# Altium footprint library 未分类器件.PcbLib: 52 footprints (part 1 of 4)
Each footprint in its own frame and in the unit in brackets; x right, y up, seen from the top. Pads: shape width x height; smd on the part's side, far side on the other; paste and mask are expansions set on the pad; w line width, h text height; cw(c..) or ccw(c..) is an arc to the next point about the centre after c.
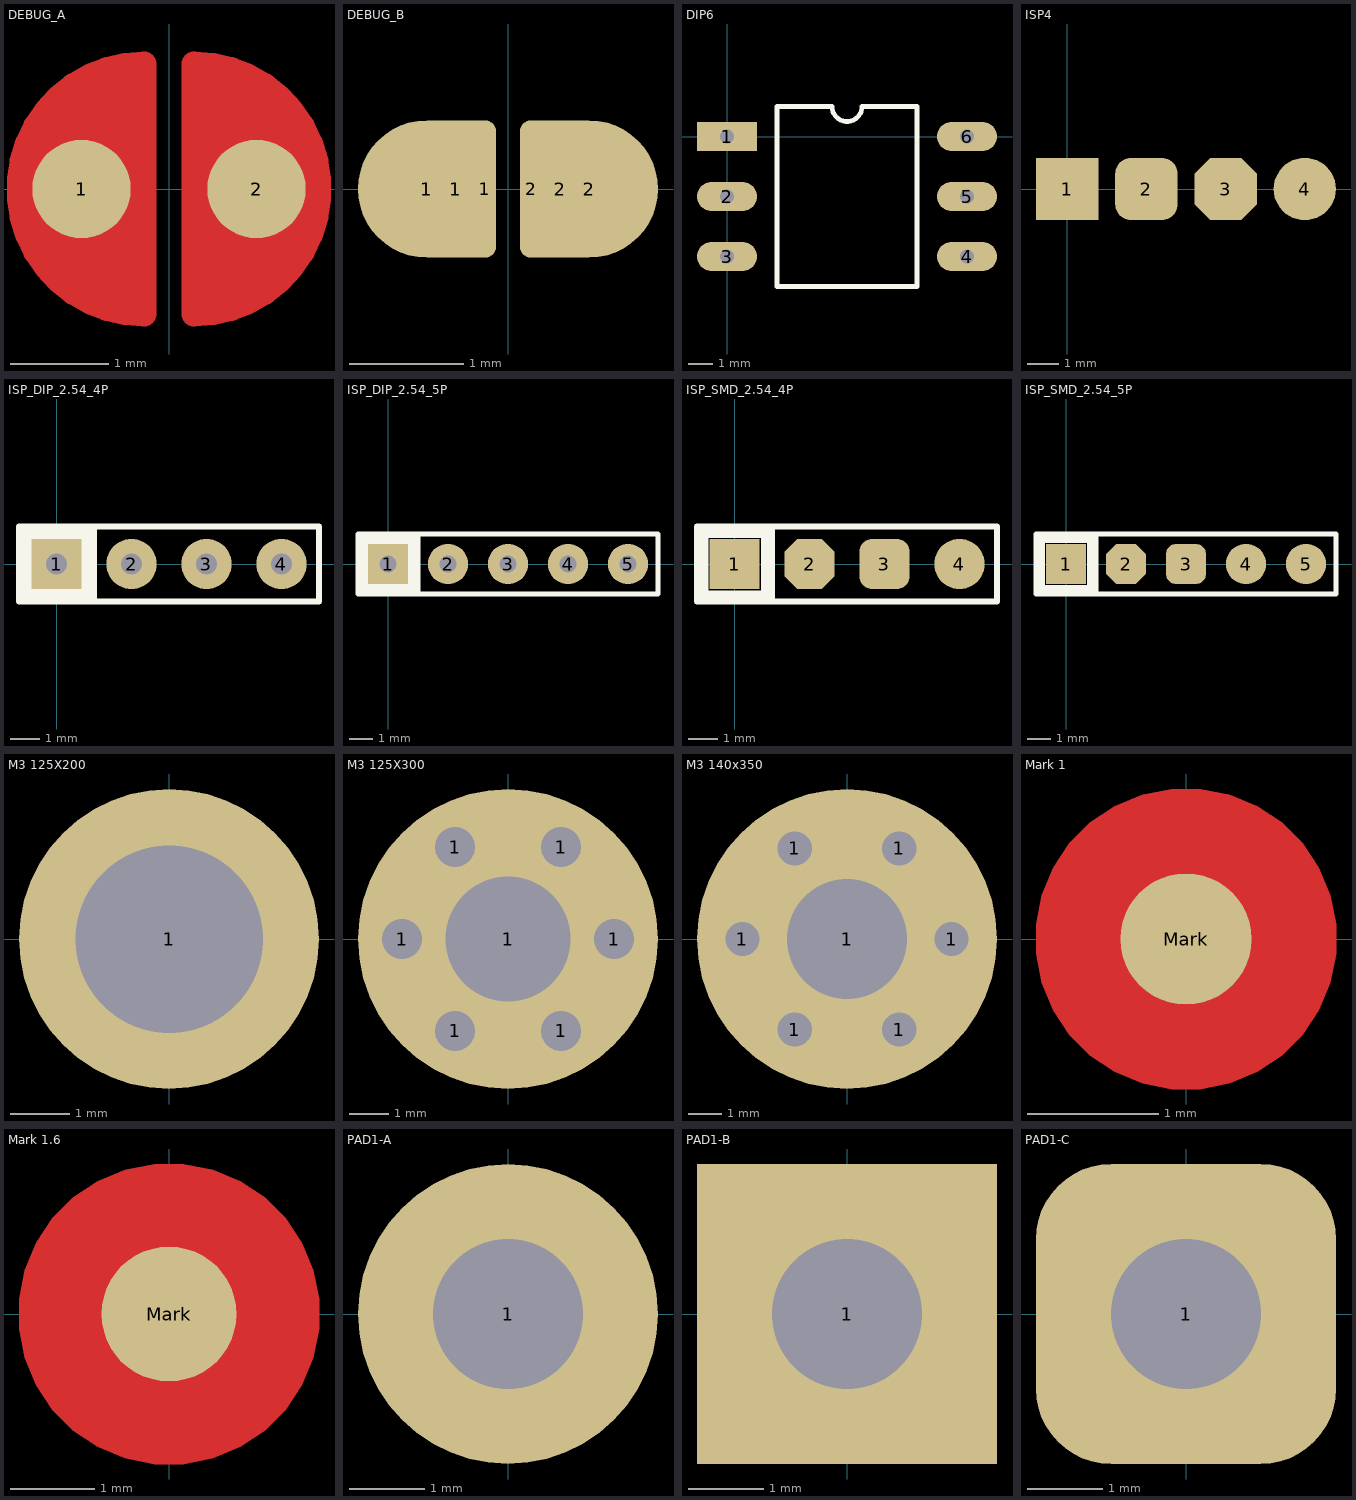
[diagram p0: the footprints below, top view; thin cyan lines are the x and y axes]

## DEBUG_A [mm] "调试断点焊盘"
pads (2):
  round 1 smd paste-1: 1(-0.889,0) 2(0.889,0)
Top Layer:
  region: -0.254,1.27 -0.254,-1.27 -0.762,-1.143 -1.397,-0.508 -1.524,0.254 -1.27,0.762 -1.016,1.016 -0.508,1.27
  region: 0.254,1.27 0.254,-1.27 0.762,-1.143 1.397,-0.508 1.524,0.254 1.27,0.762 1.016,1.016 0.508,1.27
  lines w0.254: -0.254,-1.27 cw(c-0.254,0) -0.254,1.27 -0.254,-1.27 ; 0.254,-1.27 ccw(c0.254,0) 0.254,1.27 0.254,-1.27
Top Solder:
  region: 0.254,1.27 0.254,-1.27 0.762,-1.143 1.397,-0.508 1.524,0.254 1.27,0.762 1.016,1.016 0.508,1.27
  region: -0.254,1.27 -0.254,-1.27 -0.762,-1.143 -1.397,-0.508 -1.524,0.254 -1.27,0.762 -1.016,1.016 -0.508,1.27
  lines w0.254: -0.254,-1.27 cw(c-0.254,0) -0.254,1.27 -0.254,-1.27 ; 0.254,-1.27 ccw(c0.254,0) 0.254,1.27 0.254,-1.27

## DEBUG_B [mm] "调试断点焊盘"
pads (6):
  round 1.2 smd: 1(-0.711,0) 2(0.711,0)
  rect 0.5x1.2 smd: 1(-0.457,0) 2(0.457,0)
  oval 0.2x1.2 smd: 1(-0.203,0) 2(0.203,0)

## DIP6 [mm]
pads (6):
  rect 2.5x1.2 hole 0.6: 1(0,0)
  oval 2.5x1.2 hole 0.6: 2(0,-2.5) 3(0,-5) 4(10,-5) 5(10,-2.5) 6(10,0)
Top Overlay:
  lines w0.2: 2.085,-6.25 2.085,1.25 4.375,1.25 ccw(c5,1.25) 5.625,1.25 7.915,1.25 7.915,-6.25 2.085,-6.25

## ISP4 [mm] "4P测试点"
pads (4):
  rect 2x2 smd: 1(0,0)
  rrect50% 2x2 smd: 2(2.54,0)
  oct 2x2 smd: 3(5.08,0)
  round 2 smd: 4(7.62,0)

## ISP_DIP_2.54_4P [mm] "4P 下载端口"
pads (4):
  rect 1.7x1.7 hole 0.7: 1(0,0)
  round 1.7 hole 0.7: 2(2.54,0) 3(5.08,0) 4(7.62,0)
Top Overlay:
  rectangle: -1.27,-1.27 1.27,1.27
  lines w0.203: 1.27,-1.27 1.27,1.27 ; -1.27,-1.27 8.89,-1.27 8.89,1.27 -1.27,1.27 -1.27,-1.27

## ISP_DIP_2.54_5P [mm] "5P 下载端口"
pads (5):
  rect 1.7x1.7 hole 0.7: 1(0,0)
  round 1.7 hole 0.7: 2(2.54,0) 3(5.08,0) 4(7.62,0) 5(10.16,0)
Top Overlay:
  rectangle: -1.27,-1.27 1.27,1.27
  lines w0.203: 1.27,-1.27 1.27,1.27 ; -1.27,-1.27 -1.27,1.27 11.43,1.27 11.43,-1.27 -1.27,-1.27

## ISP_SMD_2.54_4P [mm] "4P 下载端口"
pads (4):
  rect 1.7x1.7 smd paste-2: 1(0,0)
  oct 1.7x1.7 smd paste-2: 2(2.54,0)
  rrect50% 1.7x1.7 smd paste-2: 3(5.08,0)
  round 1.7 smd paste-2: 4(7.62,0)
Top Overlay:
  rectangle: -1.143,0.889 0.889,1.27
  rectangle: 0.889,-0.889 1.27,1.27
  rectangle: -0.889,-1.27 1.27,-0.889
  rectangle: -1.27,-1.27 -0.889,1.27
  lines w0.203: 1.27,-1.27 1.27,1.27 ; -1.27,-1.27 -1.27,1.27 8.89,1.27 8.89,-1.27 -1.27,-1.27

## ISP_SMD_2.54_5P [mm] "5P 下载端口"
pads (5):
  rect 1.7x1.7 smd paste-2: 1(0,0)
  oct 1.7x1.7 smd paste-2: 2(2.54,0)
  rrect50% 1.7x1.7 smd paste-2: 3(5.08,0)
  round 1.7 smd paste-2: 4(7.62,0) 5(10.16,0)
Top Overlay:
  rectangle: -1.27,-1.27 -0.889,1.27
  rectangle: -0.889,-1.27 1.27,-0.889
  rectangle: 0.889,-0.889 1.27,1.27
  rectangle: -1.27,0.889 1.016,1.27
  lines w0.203: 1.27,-1.27 1.27,1.27 ; -1.27,-1.27 -1.27,1.27 11.43,1.27 11.43,-1.27 -1.27,-1.27

## M3 125X200 [mm] "M3螺丝孔，孔125Mil，焊盘200Mil"
pads (1):
  round 5.08 hole 3.175: 1(0,0)

## M3 125X300 [mil] "M3螺丝孔，孔125Mil，焊盘300Mil"
pads (7):
  round 40 hole 40: 1(-106,0) 1(-53,-91.8) 1(-53,91.8) 1(53,-91.8) 1(53,91.8) 1(106,0)
  round 300 hole 125: 1(0,0)

## M3 140x350 [mil] "M3螺丝孔，孔140Mil，焊盘350Mil"
pads (7):
  round 35 hole 40: 1(-122,0) 1(-61,-105.66) 1(-61,105.66) 1(61,-105.66) 1(61,105.66) 1(122,0)
  round 350 hole 140: 1(0,0)

## Mark 1 [mm] "光学定位点，直径1mm"
pads (1):
  round 1 smd paste-1 mask+0.635: Mark(0,0)
Top Layer:
  pour cut-out: 0,-1.143 -0.113,-1.143 -0.333,-1.099 -0.541,-1.013 -0.729,-0.888 -0.888,-0.729 -1.013,-0.541 -1.099,-0.333 -1.143,-0.113 -1.143,0 -1.143,0.113 -1.099,0.333 -1.013,0.541 -0.888,0.729 -0.729,0.888 -0.541,1.013 -0.333,1.099 -0.113,1.143 0,1.143 0.113,1.143 0.333,1.099 0.541,1.013 0.729,0.888 0.888,0.729 1.013,0.541 1.099,0.333 1.143,0.113 1.143,0 1.143,-0.113 1.099,-0.333 1.013,-0.541 0.888,-0.729 0.729,-0.888 0.541,-1.013 0.333,-1.099 0.113,-1.143

## Mark 1.6 [mm] "光学定位点，直径1.6mm"
pads (1):
  round 1.6 smd paste-1.6 mask+0.889: Mark(0,0)
Top Layer:
  pour cut-out: 0,-1.778 -0.175,-1.778 -0.519,-1.71 -0.842,-1.576 -1.133,-1.381 -1.381,-1.133 -1.576,-0.842 -1.71,-0.519 -1.778,-0.175 -1.778,0 -1.778,0.175 -1.71,0.519 -1.576,0.842 -1.381,1.133 -1.133,1.381 -0.842,1.576 -0.519,1.71 -0.175,1.778 0,1.778 0.175,1.778 0.519,1.71 0.842,1.576 1.133,1.381 1.381,1.133 1.576,0.842 1.71,0.519 1.778,0.175 1.778,0 1.778,-0.175 1.71,-0.519 1.576,-0.842 1.381,-1.133 1.133,-1.381 0.842,-1.576 0.519,-1.71 0.175,-1.778

## PAD1-A [mm] "引线焊盘"
pads (1):
  round 4 hole 2: 1(0,0)

## PAD1-B [mm] "引线焊盘"
pads (1):
  rect 4x4 hole 2: 1(0,0)

## PAD1-C [mm] "引线焊盘"
pads (1):
  rrect50% 4x4 hole 2: 1(0,0)